# Altium footprint library MainMCUFTP.PcbLib: 96 footprints (part 3 of 6)
Each footprint in its own frame and in the unit in brackets; x right, y up, seen from the top. Pads: shape width x height; smd on the part's side, far side on the other; paste and mask are expansions set on the pad; w line width, h text height; cw(c..) or ccw(c..) is an arc to the next point about the centre after c.
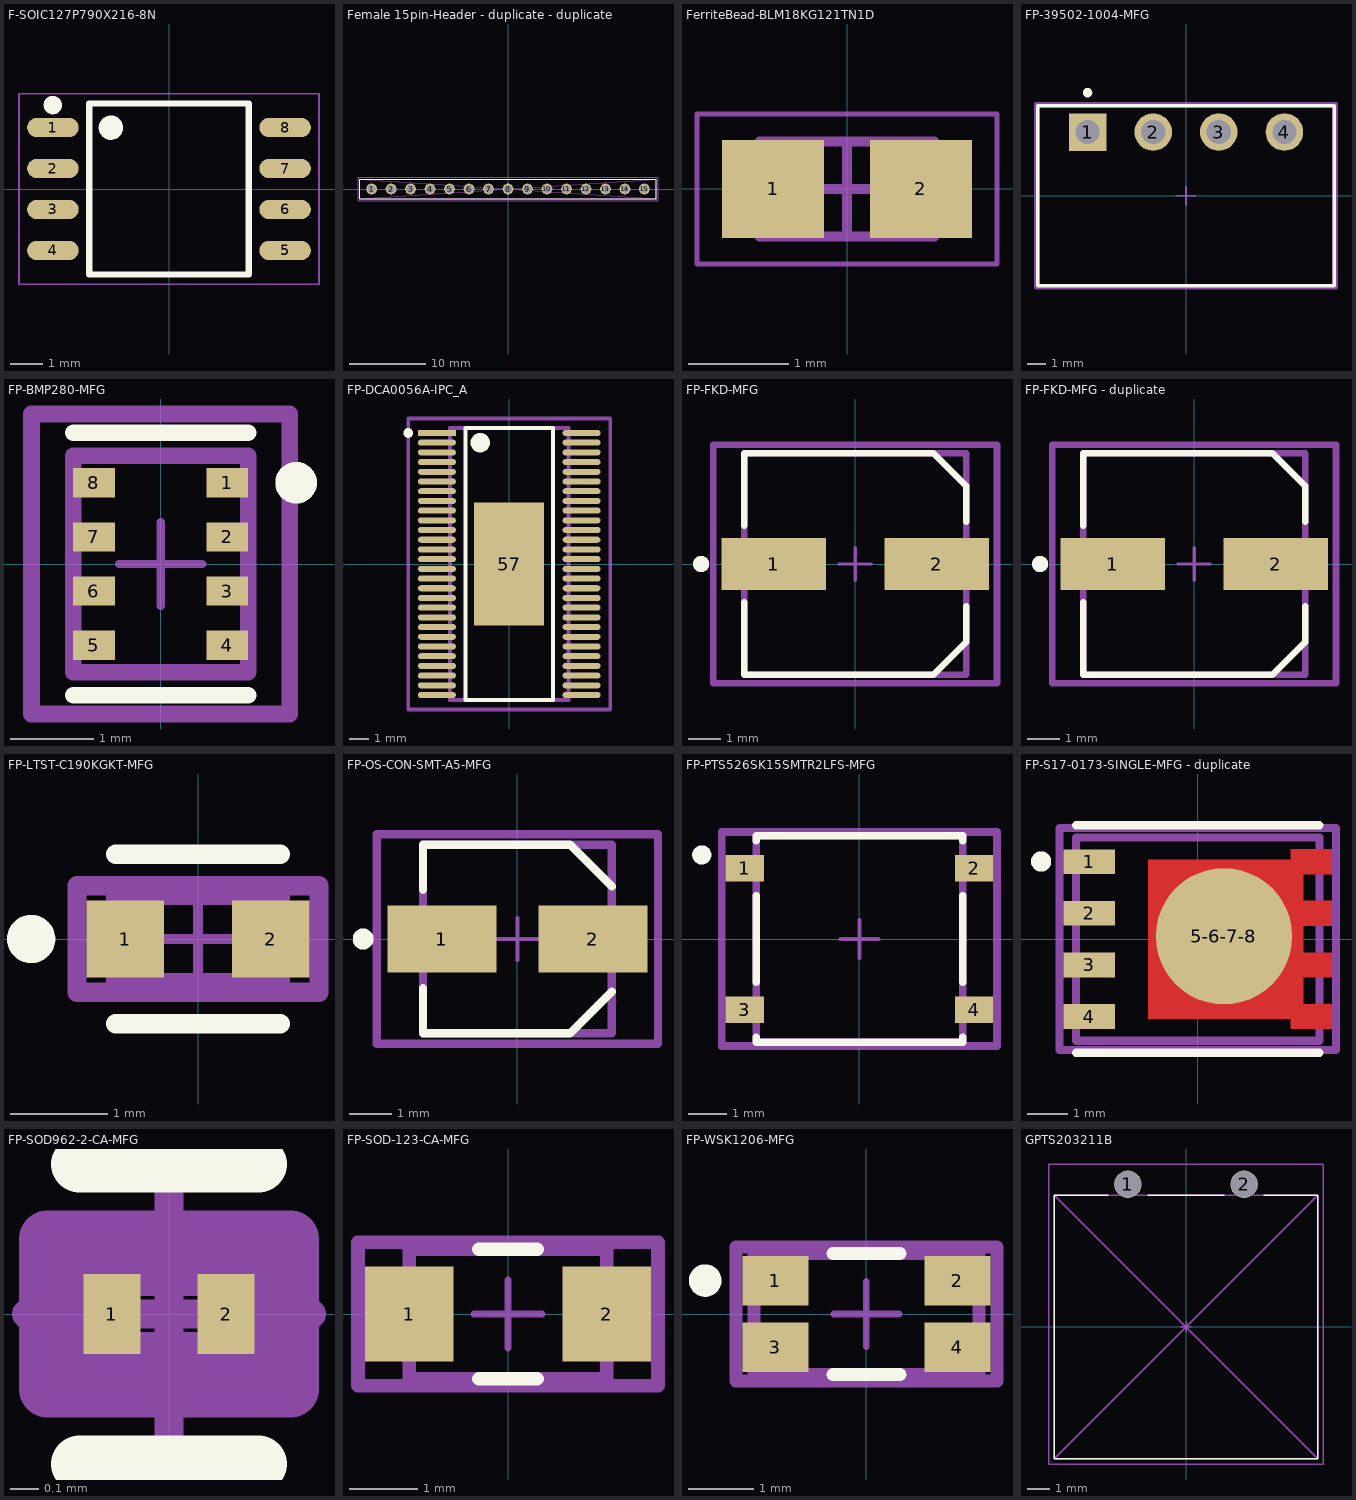
[diagram p2: the footprints below, top view; thin cyan lines are the x and y axes]

## F-SOIC127P790X216-8N [mm]
pads (8):
  oval 1.6x0.6 smd: 1(-3.6,1.905) 2(-3.6,0.635) 3(-3.6,-0.635) 4(-3.6,-1.905) 5(3.6,-1.905) 6(3.6,-0.635) 7(3.6,0.635) 8(3.6,1.905)
Top Overlay:
  circle w0.127: c-3.6,2.6 r0.1
  circle w0.127: c-3.5,2.6 r0.1
  circle w0.127: c-3.6,2.6 r0.224
  circle w0.127: c-1.8,1.8 r0.1
  circle w0.127: c-1.8,1.9 r0.1
  circle w0.127: c-1.8,1.9 r0.141
  circle w0.127: c-1.8,1.9 r0.224
  circle w0.127: c-1.8,1.9 r0.316
  lines w0.2: -2.475,-2.65 -2.475,2.65 2.475,2.65 2.475,-2.65 -2.475,-2.65
Mechanical 15:
  lines w0.05: -4.65,-2.95 -4.65,2.95 4.65,2.95 4.65,-2.95 -4.65,-2.95

## Female 15pin-Header - duplicate - duplicate [mm]
pads (15):
  round 1.4 hole 1.02 mask+0.05: 1(-17.78,0) 2(-15.24,0) 3(-12.7,0) 4(-10.16,0) 5(-7.62,0) 6(-5.08,0) 7(-2.54,0) 8(0,0) 9(2.54,0) 10(5.08,0) 11(7.62,0) 12(10.16,0) 13(12.7,0) 14(15.24,0) 15(17.78,0)
Top Overlay:
  lines w0.064: -19.3,-1.27 -19.3,1.27 19.3,1.27 19.3,-1.27 -19.3,-1.27
Mechanical 1:
  lines w0.064: -19.3,-1.27 19.3,1.27 ; -19.3,-1.27 -19.3,1.27 ; -19.3,-1.27 19.3,-1.27 ; -19.3,1.27 19.3,-1.27 ; -19.3,1.27 19.3,1.27 ; 19.3,-1.27 19.3,1.27
Top Courtyard:
  lines w0.064: -19.55,-1.52 -19.55,1.52 19.55,1.52 19.55,-1.52 -19.55,-1.52
Top Component Center:
  lines w0.064: -0.775,0 0,0 0.775,0 ; 0,-0.775 0,0.775
3D body "PPTC151LFBN-RC--3DModel-STEP-56544.STEP": height 8.51, standoff -3.2, extent -19.304,-1.27 19.304,1.27

## FerriteBead-BLM18KG121TN1D [mm]
height 0.75
pads (2):
  rect 1.02x0.98 smd: 1(-0.74,0) 2(0.74,0)
Top Courtyard:
  lines w0.05: -1.5,-0.75 1.5,-0.75 1.5,0.75 -1.5,0.75 -1.5,-0.75
  lines w0.1: -0.475,0 0.475,0 ; 0,-0.475 0,0.475
Top Assembly:
  lines w0.1: -0.875,-0.475 0.875,-0.475 0.875,0.475 -0.875,0.475 -0.875,-0.475
3D body: height 0.75, standoff 0, extent 0.475,-0.475 0.875,0.475
3D body: height 0.75, standoff 0, extent -0.875,-0.475 -0.475,0.475
3D body: height 0.75, standoff 0, extent -0.475,-0.475 0.475,0.475

## FP-39502-1004-MFG [mm]
pads (4):
  rect 2x2 hole 1.3 paste-2539.97 mask+0: 1(-5.25,3.4)
  round 2 hole 1.3 paste-2539.97 mask+0: 2(-1.75,3.4) 3(1.75,3.4) 4(5.25,3.4)
Top Overlay:
  circle w0.25: c-5.25,5.5 r0.125
  lines w0.2: -7.9,-4.8 -7.9,4.8 7.9,4.8 7.9,-4.8 -7.9,-4.8
Top 3D Body:
  lines w0.2: -7.9,-4.8 -7.9,4.8 7.9,4.8 7.9,-4.8 -7.9,-4.8
Top Courtyard:
  lines w0.2: -8,-4.9 -8,4.9 8,4.9 8,-4.9 -8,-4.9
Top Assembly:
  lines w0.2: -8,-4.9 -8,4.9 8,4.9 8,-4.9 -8,-4.9
  text ".Designator" at 0,0.188 h1
Top Component Center:
  lines w0.1: -0.5,0 0.5,0 ; 0,-0.5 0,0.5
3D body "Conn_Molex_39502-1004_eec.STEP": height 0.25, standoff 0, extent -8,-4.9 8,4.9

## FP-BMP280-MFG [mm]
pads (8):
  rect 0.5x0.35 smd paste+0 mask+0: 1(0.8,0.975) 2(0.8,0.325) 3(0.8,-0.325) 4(0.8,-0.975) 5(-0.8,-0.975) 6(-0.8,-0.325) 7(-0.8,0.325) 8(-0.8,0.975)
Top Overlay:
  circle w0.25: c1.625,0.975 r0.125
  lines w0.2: -1.05,-1.575 1.05,-1.575 ; -1.05,1.575 1.05,1.575
Top 3D Body:
  lines w0.2: -1.05,-1.3 -1.05,1.3 1.05,1.3 1.05,-1.3 -1.05,-1.3
Top Courtyard:
  lines w0.2: -1.55,-1.8 -1.55,1.8 1.55,1.8 1.55,-1.8 -1.55,-1.8
Top Assembly:
  lines w0.2: -1.55,-1.8 -1.55,1.8 1.55,1.8 1.55,-1.8 -1.55,-1.8
  text ".Designator" at 0,0.188 h1
Top Component Center:
  lines w0.1: -0.5,0 0.5,0 ; 0,-0.5 0,0.5
3D body "IC_Bosch_Sensortec_BMP280_eec.STEP": height 0.25, standoff 0, extent -1.55,-1.8 1.55,1.8

## FP-DCA0056A-IPC_A [mm]
pads (57):
  rect 1.955x0.312 smd paste+0 mask+0: 1(-3.725,6.75)
  rrect100% 1.955x0.312 smd paste+0 mask+0: 2(-3.725,6.25) 3(-3.725,5.75) 4(-3.725,5.25) 5(-3.725,4.75) 6(-3.725,4.25) 7(-3.725,3.75) 8(-3.725,3.25) 9(-3.725,2.75) 10(-3.725,2.25) 11(-3.725,1.75) 12(-3.725,1.25) 13(-3.725,0.75) 14(-3.725,0.25) 15(-3.725,-0.25) 16(-3.725,-0.75) 17(-3.725,-1.25) 18(-3.725,-1.75) 19(-3.725,-2.25) 20(-3.725,-2.75) 21(-3.725,-3.25) 22(-3.725,-3.75) 23(-3.725,-4.25) 24(-3.725,-4.75) 25(-3.725,-5.25) 26(-3.725,-5.75) 27(-3.725,-6.25) 28(-3.725,-6.75) 29(3.725,-6.75) 30(3.725,-6.25) 31(3.725,-5.75) 32(3.725,-5.25) 33(3.725,-4.75) 34(3.725,-4.25) 35(3.725,-3.75) 36(3.725,-3.25) 37(3.725,-2.75) 38(3.725,-2.25) 39(3.725,-1.75) 40(3.725,-1.25) 41(3.725,-0.75) 42(3.725,-0.25) 43(3.725,0.25) 44(3.725,0.75) 45(3.725,1.25) 46(3.725,1.75) 47(3.725,2.25) 48(3.725,2.75) 49(3.725,3.25) 50(3.725,3.75) 51(3.725,4.25) 52(3.725,4.75) 53(3.725,5.25) 54(3.725,5.75) 55(3.725,6.25) 56(3.725,6.75)
  rect 3.61x6.35 smd paste-1000 mask+0: 57(0,0)
Top Overlay:
  circle w0.5: c-1.498,6.25 r0.25
  circle w0.25: c-5.203,6.75 r0.125
  lines w0.2: -2.248,-7 2.248,-7 2.248,7 -2.248,7 -2.248,-7
Top Paste:
  rectangle: -1.197,0.304 1.197,2.567
  rectangle: -1.197,-2.567 1.197,-0.304
Top 3D Body:
  lines w0.2: -3.05,-7 3.05,-7 3.05,7 -3.05,7 -3.05,-7
Top Courtyard:
  lines w0.2: -5.203,-7.5 5.203,-7.5 5.203,7.5 -5.203,7.5 -5.203,-7.5
Top Assembly:
  lines w0.2: -5.203,-7.5 5.203,-7.5 5.203,7.5 -5.203,7.5 -5.203,-7.5
  text ".Designator" at 0,0 h1
Top Component Center:
  lines w0.1: -0.5,0 0.5,0 ; 0,-0.5 0,0.5

## FP-FKD-MFG [mm]
pads (2):
  rect 3.2x1.6 smd paste+0 mask+0: 1(-2.5,0) 2(2.5,0)
Top Overlay:
  circle w0.25: c-4.725,0 r0.125
  lines w0.2: -3.4,-1.175 -3.4,-3.4 2.4,-3.4 3.4,-2.4 3.4,-1.3 ; -3.4,1.175 -3.4,3.4 2.4,3.4 3.4,2.4 3.4,1.3
Top 3D Body:
  lines w0.2: -3.4,-3.4 3.4,-3.4 3.4,3.4 -3.4,3.4 -3.4,-3.4
Top Courtyard:
  lines w0.2: -4.35,-3.65 4.35,-3.65 4.35,3.65 -4.35,3.65 -4.35,-3.65
Top Assembly:
  lines w0.2: -4.35,-3.65 4.35,-3.65 4.35,3.65 -4.35,3.65 -4.35,-3.65
  text ".Designator" at 0,0.188 h1
Top Component Center:
  lines w0.1: -0.5,0 0.5,0 ; 0,-0.5 0,0.5
3D body "Cap_Panasonic_Electronic_Components_EEE-FK0J221P_eec.STEP": height 0.25, standoff 0, extent -4.35,-3.65 4.35,3.65

## FP-FKD-MFG - duplicate [mm]
pads (2):
  rect 3.2x1.6 smd paste+0 mask+0: 1(-2.5,0) 2(2.5,0)
Top Overlay:
  circle w0.25: c-4.725,0 r0.125
  lines w0.2: -3.4,-1.175 -3.4,-3.4 2.4,-3.4 3.4,-2.4 3.4,-1.3 ; -3.4,1.175 -3.4,3.4 2.4,3.4 3.4,2.4 3.4,1.3
Top 3D Body:
  lines w0.2: -3.4,-3.4 3.4,-3.4 3.4,3.4 -3.4,3.4 -3.4,-3.4
Top Courtyard:
  lines w0.2: -4.35,-3.65 4.35,-3.65 4.35,3.65 -4.35,3.65 -4.35,-3.65
Top Assembly:
  lines w0.2: -4.35,-3.65 4.35,-3.65 4.35,3.65 -4.35,3.65 -4.35,-3.65
  text ".Designator" at 0,0.188 h1
Top Component Center:
  lines w0.1: -0.5,0 0.5,0 ; 0,-0.5 0,0.5
3D body "Cap_Panasonic_Electronic_Components_EEE-FK0J221P_eec.STEP": height 0.25, standoff 0, extent -4.35,-3.65 4.35,3.65

## FP-LTST-C190KGKT-MFG [mm]
pads (2):
  rect 0.8x0.8 smd paste+0 mask+0: 1(-0.75,0) 2(0.75,0)
Top Overlay:
  circle w0.25: c-1.725,0 r0.125
  lines w0.2: -0.85,-0.875 0.85,-0.875 ; -0.85,0.875 0.85,0.875
Top 3D Body:
  lines w0.2: -0.85,-0.45 0.85,-0.45 0.85,0.45 -0.85,0.45 -0.85,-0.45
Top Courtyard:
  lines w0.2: -1.25,-0.55 1.25,-0.55 1.25,0.55 -1.25,0.55 -1.25,-0.55
Top Assembly:
  lines w0.2: -1.25,-0.55 1.25,-0.55 1.25,0.55 -1.25,0.55 -1.25,-0.55
  text ".Designator" at 0,0 h1
Top Component Center:
  lines w0.1: -0.5,0 0.5,0 ; 0,-0.5 0,0.5
3D body "Diode_Lite-On_LTST-C190KGKT_eec.STEP": height 0.25, standoff 0, extent -1.25,-0.55 1.25,0.55

## FP-OS-CON-SMT-A5-MFG [mm]
pads (2):
  rect 2.6x1.6 smd paste+0 mask+0: 1(-1.8,0) 2(1.8,0)
Top Overlay:
  circle w0.25: c-3.675,0 r0.125
  lines w0.2: -2.25,-1.175 -2.25,-2.25 1.25,-2.25 2.25,-1.25 ; -2.25,1.175 -2.25,2.25 1.25,2.25 2.25,1.25
Top 3D Body:
  lines w0.2: -2.25,-2.25 -2.25,2.25 2.25,2.25 2.25,-2.25 -2.25,-2.25
Top Courtyard:
  lines w0.2: -3.35,-2.5 -3.35,2.5 3.35,2.5 3.35,-2.5 -3.35,-2.5
Top Assembly:
  lines w0.2: -3.35,-2.5 -3.35,2.5 3.35,2.5 3.35,-2.5 -3.35,-2.5
  text ".Designator" at 0,0.188 h1
Top Component Center:
  lines w0.1: -0.5,0 0.5,0 ; 0,-0.5 0,0.5
3D body "Cap_Panasonic_10SVP10M_eec.STEP": height 0.25, standoff 0, extent -3.35,-2.5 3.35,2.5

## FP-PTS526SK15SMTR2LFS-MFG [mm]
pads (4):
  rect 1x0.7 smd paste+0 mask+0: 1(-3,1.85) 2(3,1.85) 3(-3,-1.85) 4(3,-1.85)
Top Overlay:
  circle w0.25: c-4.125,2.2 r0.125
  lines w0.2: -2.7,-2.575 -2.7,-2.7 2.7,-2.7 2.7,-2.575 ; -2.7,-1.125 -2.7,1.125 ; -2.7,2.575 -2.7,2.7 2.7,2.7 2.7,2.575 ; 2.7,-1.125 2.7,1.125
Top 3D Body:
  lines w0.2: -2.7,-2.7 -2.7,2.7 2.7,2.7 2.7,-2.7 -2.7,-2.7
Top Courtyard:
  lines w0.2: -3.6,-2.8 -3.6,2.8 3.6,2.8 3.6,-2.8 -3.6,-2.8
Top Assembly:
  lines w0.2: -3.6,-2.8 -3.6,2.8 3.6,2.8 3.6,-2.8 -3.6,-2.8
  text ".Designator" at 0,0.188 h1
Top Component Center:
  lines w0.1: -0.5,0 0.5,0 ; 0,-0.5 0,0.5
3D body "Switch_C&K_PTS526SK15SMTR2LFS_eec.STEP": height 0.25, standoff 0, extent -3.6,-2.8 3.6,2.8

## FP-S17-0173-SINGLE-MFG - duplicate [mil]
pads (5):
  rect 50x24 smd paste+0 mask+0: 1(-105,75) 2(-105,25) 3(-105,-25) 4(-105,-75)
  round 132.13 smd paste+0 mask+0: 5-6-7-8(25.41,2.72)
Top Layer:
  region: -48,77 90,77 90,87 130,87 130,63 102,63 102,37 130,37 130,13 102,13 102,-13 130,-13 130,-37 102,-37 102,-63 130,-63 130,-87 90,-87 90,-77 -48,-77
Top Overlay:
  circle w9.84: c-151.77,75.19 r4.92
  lines w7.87: -117.91,-110.04 117.91,-110.04 ; -117.91,110.24 117.91,110.24
Top 3D Body:
  lines w7.87: -117.91,-98.43 117.91,-98.43 117.91,98.43 -117.91,98.43 -117.91,-98.43
Top Courtyard:
  lines w7.87: -133.94,-107.48 133.94,-107.48 133.94,107.48 -133.94,107.48 -133.94,-107.48
Top Assembly:
  lines w7.87: -133.94,-107.48 133.94,-107.48 133.94,107.48 -133.94,107.48 -133.94,-107.48
  text ".Designator" at 0,7.41 h39.37
Top Component Center:
  lines w3.94: -19.68,0 19.68,0 ; 0,-19.68 0,19.68
3D body "Trans_Vishay_SIR182DP-T1-RE3_eec.STEP": height 10, standoff 0, extent -133.94,-107.48 133.94,107.48

## FP-SOD962-2-CA-MFG [mm]
pads (2):
  rect 0.2x0.28 smd paste-1000 mask-1000: 1(-0.2,0) 2(0.2,0)
Top Overlay:
  lines w0.2: -0.312,-0.525 0.312,-0.525 ; -0.312,0.525 0.312,0.525
Top Paste:
  circle w0.128: c0.208,0 r0.064
  circle w0.128: c-0.208,0 r0.064
Top Solder:
  rectangle: 0.08,-0.14 0.336,0.14
  rectangle: -0.336,-0.14 -0.08,0.14
Top 3D Body:
  lines w0.2: -0.312,-0.162 -0.312,0.162 0.312,0.162 0.312,-0.162 -0.312,-0.162
Top Courtyard:
  lines w0.2: -0.425,-0.262 -0.425,0.262 0.425,0.262 0.425,-0.262 -0.425,-0.262
Top Assembly:
  lines w0.2: -0.425,-0.262 -0.425,0.262 0.425,0.262 0.425,-0.262 -0.425,-0.262
  text ".Designator" at 0,0 h1
Top Component Center:
  lines w0.1: -0.5,0 0.5,0 ; 0,-0.5 0,0.5
3D body "Diode_Nexperia_PESD3V3Y1BSFYL_eec.STEP": height 0.25, standoff 0, extent -0.425,-0.262 0.425,0.262

## FP-SOD-123-CA-MFG [mm]
pads (2):
  rect 1.3x1.4 smd paste+0 mask+0: 1(-1.45,0) 2(1.45,0)
Top Overlay:
  lines w0.2: -0.425,-0.95 0.425,-0.95 ; -0.425,0.95 0.425,0.95
Top 3D Body:
  lines w0.2: -1.45,-0.95 -1.45,0.95 1.45,0.95 1.45,-0.95 -1.45,-0.95
Top Courtyard:
  lines w0.2: -2.2,-1.05 -2.2,1.05 2.2,1.05 2.2,-1.05 -2.2,-1.05
Top Assembly:
  lines w0.2: -2.2,-1.05 -2.2,1.05 2.2,1.05 2.2,-1.05 -2.2,-1.05
  text ".Designator" at 0.127,0.315 h1
Top Component Center:
  lines w0.1: -0.5,0 0.5,0 ; 0,-0.5 0,0.5
3D body "Diode_Comchip_Technology_ATV02W150B-HF_eec.STEP": height 0.25, standoff 0, extent -2.2,-1.05 2.2,1.05

## FP-WSK1206-MFG [mil]
pads (4):
  rect 40x30 smd paste+0 mask+0: 1(-55,20) 2(55,20) 3(-55,-20) 4(55,-20)
Top Overlay:
  circle w9.84: c-97.53,20.24 r4.92
  lines w7.87: -20.24,-36.5 20.24,-36.5 ; -20.24,36.5 20.24,36.5
Top 3D Body:
  lines w7.87: -68,-36.5 -68,36.5 68,36.5 68,-36.5 -68,-36.5
Top Courtyard:
  lines w7.87: -78.94,-40.44 -78.94,40.44 78.94,40.44 78.94,-40.44 -78.94,-40.44
Top Assembly:
  lines w7.87: -78.94,-40.44 -78.94,40.44 78.94,40.44 78.94,-40.44 -78.94,-40.44
  text ".Designator" at 0,7.41 h39.37
Top Component Center:
  lines w3.94: -19.68,0 19.68,0 ; 0,-19.68 0,19.68
3D body "Res_Vishay_WSK1206R0100FEA18_eec.STEP": height 10, standoff 0, extent -78.94,-40.44 78.94,40.44

## GPTS203211B [mm]
pads (2):
  round 1.25 hole 1.2 mask+0.05: 1(-2.65,6.5) 2(2.65,6.5)
Top Overlay:
  lines w0.064: -3.55,6 -6,6 -6,-6 6,-6 6,6 3.55,6 ; -1.75,6 1.75,6
Mechanical 1:
  lines w0.064: -6,-6 -6,6 ; -6,-6 6,-6 ; -6,-6 6,6 ; -6,6 6,6 ; -6,6 6,-6 ; 6,-6 6,6
Top Courtyard:
  lines w0.064: -6.25,-6.25 -6.25,7.425 -6.075,7.425 6.025,7.425 6.25,7.425 6.25,-6.25 -6.25,-6.25
Top Component Center:
  lines w0.064: -0.25,0 0.25,0 0,0 ; 0,-0.25 0,0.25
3D body "CW GPTS203211B.SLDPRT": height 9.1, standoff -2.2, extent -6,-6 6,6.9